# Altium footprint library lib.PcbLib: 145 footprints (part 10 of 10)
Each footprint in its own frame and in the unit in brackets; x right, y up, seen from the top. Pads: shape width x height; smd on the part's side, far side on the other; paste and mask are expansions set on the pad; w line width, h text height; cw(c..) or ccw(c..) is an arc to the next point about the centre after c.
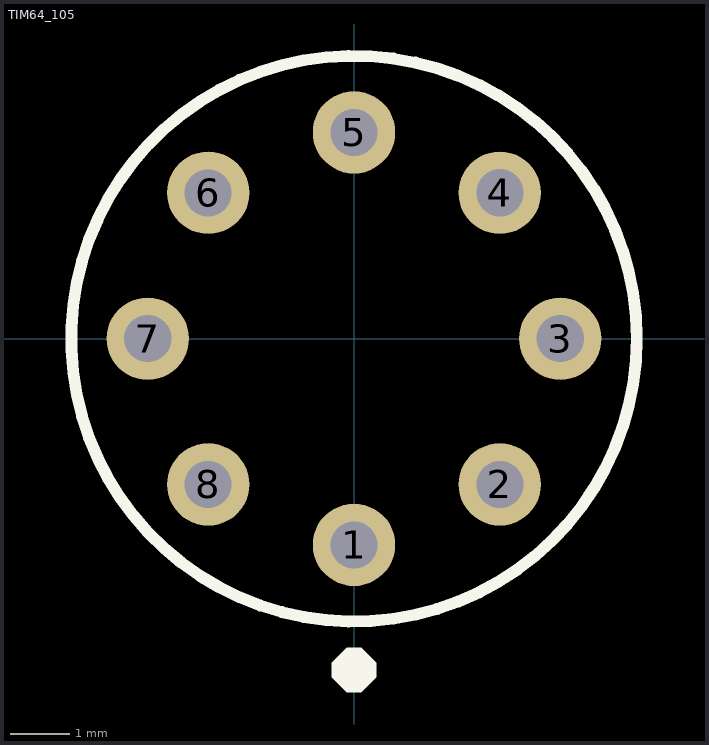
[diagram p9: the footprint, top view; thin cyan lines are the x and y axes]

## TIM64_105 [mm] "1.2g"
height 9.5
pads (8):
  round 1.4 hole 0.8: 1(0,-3.5) 2(2.475,-2.475) 3(3.5,0) 4(2.475,2.475) 5(0,3.5) 6(-2.475,2.475) 7(-3.5,0) 8(-2.475,-2.475)
Top Overlay:
  circle w0.2: c0,0 r4.8
  region: -0.375,-5.75 -0.125,-6 0.125,-6 0.375,-5.75 0.375,-5.5 0.125,-5.25 -0.125,-5.25 -0.375,-5.5
Mechanical 25:
  text "3" at 1.75,-0.5 h2
  text "5" at -0.5,1.25 h2
  text "7" at -2.25,-0.5 h2
  text "1" at -0.25,-2.5 h2